# Altium footprint library ParsaLibrary.PcbLib: 526 footprints (part 25 of 33)
Each footprint in its own frame and in the unit in brackets; x right, y up, seen from the top. Pads: shape width x height; smd on the part's side, far side on the other; paste and mask are expansions set on the pad; w line width, h text height; cw(c..) or ccw(c..) is an arc to the next point about the centre after c.
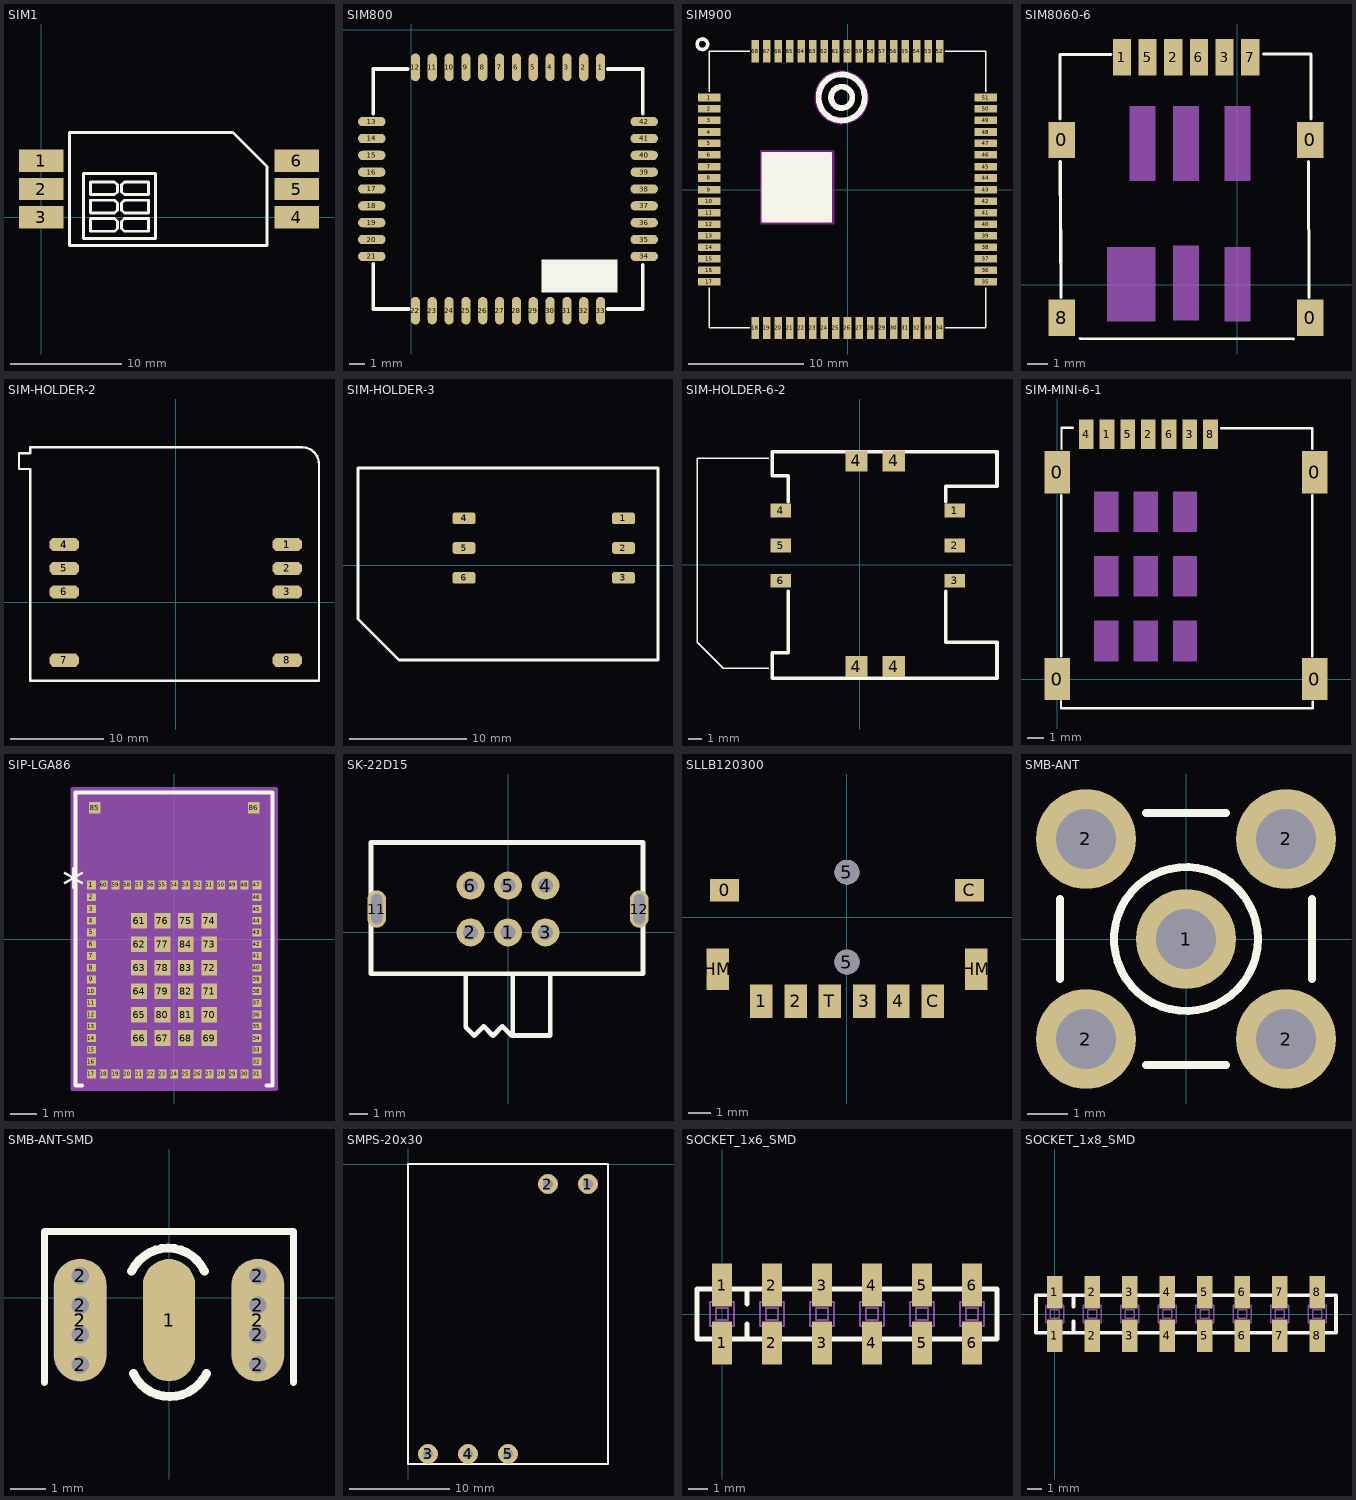
[diagram p24: the footprints below, top view; thin cyan lines are the x and y axes]

## SIM1 [mm]
pads (6):
  rect 4x2 smd: 1(0,5.08) 2(0,2.54) 3(0,0) 4(23,0) 5(23,2.54) 6(23,5.08)
Top Overlay:
  lines w0.254: 2.54,-2.54 20.32,-2.54 20.32,4.572 17.272,7.62 2.54,7.62 2.54,-2.54 ; 3.81,-1.905 10.287,-1.905 10.287,3.937 3.81,3.937 3.81,-1.905 ; 4.445,-1.27 4.445,-0.127 6.604,-0.127 6.858,-0.381 6.858,-1.016 6.604,-1.27 4.445,-1.27 ; 4.445,0.381 4.445,1.524 6.604,1.524 6.858,1.27 6.858,0.635 6.604,0.381 4.445,0.381 ; 4.445,2.032 6.604,2.032 6.858,2.286 6.858,2.921 6.604,3.175 4.445,3.175 4.445,2.032 ; 7.239,-1.016 7.239,-0.381 7.493,-0.127 9.652,-0.127 9.652,-1.27 7.493,-1.27 7.239,-1.016 ; 7.239,0.635 7.493,0.381 9.652,0.381 9.652,1.524 7.493,1.524 7.239,1.27 7.239,0.635 ; 7.239,2.286 7.493,2.032 9.652,2.032 9.652,3.175 7.493,3.175 7.239,2.921 7.239,2.286

## SIM800 [mm]
pads (42):
  oval 0.6x1.8 smd: 1(12.363,-2.44) 2(11.263,-2.44) 3(10.163,-2.44) 4(9.063,-2.44) 5(7.963,-2.44) 6(6.863,-2.44) 7(5.763,-2.44) 8(4.663,-2.44) 9(3.563,-2.44) 10(2.463,-2.44) 11(1.363,-2.44) 12(0.263,-2.44) 22(0.263,-18.34) 23(1.363,-18.34) 24(2.463,-18.34) 25(3.563,-18.34) 26(4.663,-18.34) 27(5.763,-18.34) 28(6.863,-18.34) 29(7.963,-18.34) 30(9.063,-18.34) 31(10.163,-18.34) 32(11.263,-18.34) 33(12.363,-18.34)
  oval 1.8x0.6 smd: 13(-2.587,-5.99) 14(-2.587,-7.09) 15(-2.587,-8.19) 16(-2.587,-9.29) 17(-2.587,-10.39) 18(-2.587,-11.49) 19(-2.587,-12.59) 20(-2.587,-13.69) 21(-2.587,-14.79) 34(15.213,-14.79) 35(15.213,-13.69) 36(15.213,-12.59) 37(15.213,-11.49) 38(15.213,-10.39) 39(15.213,-9.29) 40(15.213,-8.19) 41(15.213,-7.09) 42(15.213,-5.99)
Top Overlay:
  rectangle: 8.509,-17.136 13.459,-14.986
  lines w0.254: -2.487,-15.293 -2.487,-18.24 -0.175,-18.24 ; -2.487,-5.461 -2.487,-2.54 -0.254,-2.54 ; 12.827,-18.24 15.113,-18.24 15.113,-15.367 ; 12.827,-2.54 15.113,-2.54 15.113,-5.461
Multi-Layer:
  pour cut-out: 8.509,-14.986 13.459,-14.986 13.459,-17.136 8.509,-17.136
3D body "User Library-SIM800C.step": height 2.3, standoff -0.01, extent -2.45,-18.264 15.15,-2.564

## SIM900 [mil]
pads (68):
  rect 76x26 smd: 1(-472.72,314.72) 2(-472.72,275.72) 3(-472.72,236.72) 4(-472.72,196.72) 5(-472.72,157.72) 6(-472.72,118.72) 7(-472.72,78.72) 8(-472.72,39.72) 9(-472.72,-0.28) 10(-472.72,-39.65) 11(-472.72,-79.02) 12(-472.72,-118.39) 13(-472.72,-157.76) 14(-472.72,-197.13) 15(-472.72,-236.5) 16(-472.72,-275.87) 17(-472.72,-315.24) 35(472.72,-315.24) 36(472.72,-275.87) 37(472.72,-236.5) 38(472.72,-197.13) 39(472.72,-157.76) 40(472.72,-118.39) 41(472.72,-79.02) 42(472.72,-39.65) 43(472.72,-0.28) 44(472.72,39.72) 45(472.72,78.72) 46(472.72,118.72) 47(472.72,157.72) 48(472.72,196.72) 49(472.72,236.72) 50(472.72,275.72) 51(472.72,314.72)
  rect 26x76 smd: 18(-315.24,-472.72) 19(-275.87,-472.72) 20(-236.5,-472.72) 21(-197.13,-472.72) 22(-157.76,-472.72) 23(-118.39,-472.72) 24(-79.02,-472.72) 25(-39.65,-472.72) 26(-0.28,-472.72) 27(39.72,-472.72) 28(78.72,-472.72) 29(118.72,-472.72) 30(157.72,-472.72) 31(196.72,-472.72) 32(236.72,-472.72) 33(275.72,-472.72) 34(314.72,-472.72) 52(314.72,472.72) 53(275.72,472.72) 54(236.72,472.72) 55(196.72,472.72) 56(157.72,472.72) 57(118.72,472.72) 58(78.72,472.72) 59(39.72,472.72) 60(-0.28,472.72) 61(-39.65,472.72) 62(-79.02,472.72) 63(-118.39,472.72) 64(-157.76,472.72) 65(-197.13,472.72) 66(-236.5,472.72) 67(-275.87,472.72) 68(-315.24,472.72)
Top Overlay:
  circle w19.68: c-20,315 r78.74
  circle w12: c-496.34,496.72 r18
  circle w19.68: c-20,315 r36.4
  rectangle: -291.62,-110.52 -55.4,125.72
  lines w5: -472.72,-334.93 -472.72,-472.72 -334.93,-472.72 ; -472.72,334.72 -472.72,472.72 -334.93,472.72 ; 334.72,-472.72 472.72,-472.72 472.72,-334.93 ; 334.72,472.72 472.72,472.72 472.72,334.72 ; -291.62,-110.52 -291.62,125.72 -55.4,125.72 -55.4,-110.52 -291.62,-110.52
Keep-Out Layer:
  circle w5: c-19.96,314.72 r90.04
  lines w10: -295,-115 -295,130 -50,130 -50,-115 -295,-115
Mechanical 2:
Mechanical 4:
Mechanical 16:
3D body "SIMCOM_SIM900.STEP": height 118.5, standoff 0.16, extent -474.4,-474.41 474.42,474.41

## SIM8060-6 [mm]
pads (10):
  rect 1.3x1.8 smd: 0(-8.693,7.174) 0(3.607,-1.626) 0(3.607,7.174) 8(-8.693,-1.626)
  rect 0.9x1.8 smd: 1(-5.713,11.274) 2(-3.173,11.274) 3(-0.633,11.274) 5(-4.443,11.274) 6(-1.903,11.274) 7(0.637,11.274)
Top Overlay:
  lines w0.15: -8.781,8.216 -8.781,11.416 -6.255,11.416 ; -8.769,6.108 -8.744,-0.623 ; -7.802,-2.647 2.788,-2.681 ; 1.289,11.442 3.651,11.442 3.651,8.216 ; 3.531,6.108 3.556,-0.623
Mechanical 1:
  rectangle: -0.643,5.15 0.657,8.85
  rectangle: -3.193,5.15 -1.893,8.85
  rectangle: -6.453,-1.826 -4.053,1.874
  rectangle: -3.193,-1.753 -1.893,1.947
  rectangle: -0.643,-1.826 0.657,1.874
  rectangle: -5.353,5.15 -4.053,8.85
3D body "User Library-SIM8060.x_t": height 1.4, standoff -0.05, extent -8.764,-2.573 3.636,11.427

## SIM-HOLDER-2 [mm]
pads (10):
  oct 3.2x1.4 smd: 1(11.954,6.2) 1(11.954,6.2) 2(11.954,3.66) 3(11.954,1.12) 4(-11.954,6.2) 4(-11.954,6.2) 5(-11.954,3.66) 6(-11.954,1.12) 7(-11.954,-6.2) 8(11.954,-6.2)
Top Overlay:
  lines w0.254: -15.634,14.304 -16.802,14.304 -16.802,15.981 -15.583,15.981 -15.583,16.619 13.573,16.619 cw(c13.573,14.832) 15.36,14.832 15.36,-8.381 -15.583,-8.381 -15.583,14.304
3D body "912283001.stp": height 3.1, standoff 0, extent -16.84,-8.381 15.36,16.619

## SIM-HOLDER-3 [mm]
pads (7):
  rrect50% 2x1 smd: 1(-4.946,4) 2(-4.946,1.46) 3(-4.946,-1.08) 4(-18.554,4) 4(-18.554,4) 5(-18.554,1.46) 6(-18.554,-1.08)
Top Overlay:
  lines w0.254: -27.6,-4.6 -27.6,8.3 -2,8.3 -2,-8.1 -24.1,-8.1 -27.6,-4.6
3D body "User Library-Sim Card Holder.step": height 1.8, standoff 0, extent -18.3,-8.1 -2,8.3
3D body: height 1.5, standoff 0.8, extent -27.6,-7.4 -2.6,7.6

## SIM-HOLDER-6-2 [mm]
pads (10):
  rect 1.5x1 smd: 1(6.858,3.937) 2(6.858,1.397) 3(6.858,-1.143) 4(-5.742,3.937) 5(-5.742,1.397) 6(-5.742,-1.143)
  rect 1.6x1.5 smd: 4(-0.254,-7.366) 4(-0.254,7.534) 4(2.446,-7.366) 4(2.446,7.534)
Top Overlay:
  lines w0.1: -6.604,-7.493 -9.906,-7.493 -11.811,-5.588 -11.811,7.747 -6.604,7.747
  lines w0.254: -5.207,-1.905 -5.207,-6.35 -6.372,-6.35 -6.372,-8.2 9.928,-8.2 9.928,-5.588 6.223,-5.588 6.223,-1.905 ; -5.207,4.572 -5.207,6.477 -6.372,6.477 -6.372,8.2 9.928,8.2 9.928,5.715 6.223,5.715 6.223,4.572
3D body "693010020611.stp": height 1.8, standoff 0, extent -6.372,-8.2 9.928,8.2

## SIM-MINI-6-1 [mm]
pads (11):
  rect 1.55x2.6 smd: 0(0,0) 0(0,12.68) 0(15.8,0) 0(15.8,12.68)
  rect 0.9x1.8 smd: 1(3.05,15.01) 2(5.59,15.01) 3(8.13,15.01) 4(1.78,15.01) 5(4.32,15.01) 6(6.86,15.01) 8(9.4,15.01)
Top Overlay:
  lines w0.15: 0.232,-1.372 0.232,-1.8 15.642,-1.8 15.671,-1.8 15.671,-1.39 ; 0.261,1.401 0.261,11.273 ; 0.263,14.126 0.263,15.412 0.961,15.412 ; 10.061,15.389 15.657,15.389 15.657,14.126 ; 15.642,1.395 15.642,11.278
Mechanical 1:
  rectangle: 7.089,9.008 8.589,11.508
  rectangle: 4.673,9.008 6.173,11.508
  rectangle: 7.089,5.048 8.589,7.548
  rectangle: 4.673,5.048 6.173,7.548
  rectangle: 2.257,5.048 3.757,7.548
  rectangle: 2.257,1.088 3.757,3.588
  rectangle: 4.673,1.088 6.173,3.588
  rectangle: 7.089,1.088 8.589,3.588
  rectangle: 2.257,9.008 3.757,11.508
3D body "Part1_1.STEP": height 1.35, standoff 0, extent -0.324,-1.641 16.176,15.309

## SIP-LGA86 [mm]
pads (86):
  rect 0.35x0.35 smd paste-0.175 mask-0.178: 1(-3.175,2.075) 17(-3.175,-5.175) 31(3.175,-5.175) 47(3.175,2.075)
  rect 0.35x0.3 smd paste+0 mask+0: 2(-3.175,1.6) 3(-3.175,1.15) 4(-3.175,0.7) 5(-3.175,0.25) 6(-3.175,-0.2) 7(-3.175,-0.65) 8(-3.175,-1.1) 9(-3.175,-1.55) 10(-3.175,-2) 11(-3.175,-2.45) 12(-3.175,-2.9) 13(-3.175,-3.35) 14(-3.175,-3.8) 15(-3.175,-4.25) 16(-3.175,-4.7) 32(3.175,-4.7) 33(3.175,-4.25) 34(3.175,-3.8) 35(3.175,-3.35) 36(3.175,-2.9) 37(3.175,-2.45) 38(3.175,-2) 39(3.175,-1.55) 40(3.175,-1.1) 41(3.175,-0.65) 42(3.175,-0.2) 43(3.175,0.25) 44(3.175,0.7) 45(3.175,1.15) 46(3.175,1.6)
  rect 0.3x0.35 smd paste+0 mask+0: 18(-2.7,-5.175) 19(-2.25,-5.175) 20(-1.8,-5.175) 21(-1.35,-5.175) 22(-0.9,-5.175) 23(-0.45,-5.175) 24(0,-5.175) 25(0.45,-5.175) 26(0.9,-5.175) 27(1.35,-5.175) 28(1.8,-5.175) 29(2.25,-5.175) 30(2.7,-5.175) 48(2.7,2.075) 49(2.25,2.075) 50(1.8,2.075) 51(1.35,2.075) 52(0.9,2.075) 53(0.45,2.075) 54(0,2.075) 55(-0.45,2.075) 56(-0.9,2.075) 57(-1.35,2.075) 58(-1.8,2.075) 59(-2.25,2.075) 60(-2.7,2.075)
  rect 0.6x0.6 smd paste-0.3 mask-0.305: 61(-1.35,0.7) 62(-1.35,-0.2) 63(-1.35,-1.1) 64(-1.35,-2) 65(-1.35,-2.9) 66(-1.35,-3.8) 67(-0.45,-3.8) 68(0.45,-3.8) 69(1.35,-3.8) 70(1.35,-2.9) 71(1.35,-2) 72(1.35,-1.1) 73(1.35,-0.2) 74(1.35,0.7) 75(0.45,0.7) 76(-0.45,0.7) 77(-0.45,-0.2) 78(-0.45,-1.1) 79(-0.45,-2) 80(-0.45,-2.9) 81(0.45,-2.9) 82(0.45,-2) 83(0.45,-1.1) 84(0.45,-0.2)
  rect 0.43x0.43 smd paste-0.215 mask-0.216: 85(-3.05,5.035) 86(3.05,5.035)
Top Overlay:
  lines w0.152: -3.534,-5.627 -3.777,-5.627 -3.777,5.627 3.777,5.627 3.777,-5.627 3.534,-5.627
  text "*" at -4.303,1.44 h1.27
Mechanical 13:
  lines w0.025: -3.65,-5.5 3.65,-5.5 3.65,5.5 -3.65,5.5 -3.65,-5.5
  text "*" at -3.167,1.265 h1.27
Mechanical 15:
  region: 3.904,-5.754 3.904,5.754 -3.904,5.754 -3.904,-5.754
  lines w0.152: -3.904,-5.754 -3.904,5.754 3.904,5.754 3.904,-5.754 -3.904,-5.754
3D body "User Library-SiP-LGA86.X_B": height 1.3, standoff -0.04, extent -3.65,-5.5 3.65,5.5

## SK-22D15 [mm] "2P2T SWITCH"
height 8.5
pads (8):
  round 1.5 hole 0.8: 1(0,0) 2(-2,0) 3(2,0) 4(2,2.5) 5(0,2.5) 6(-2,2.5)
  oval 1x2 hole 0.6 slot 1.6 at 90 deg: 11(-7,1.25) 12(7,1.25)
Top Overlay:
  lines w0.254: -2.25,-5 -2.25,-5.05 ; -2.25,-2.2 -2.25,-5.05 ; 0.2,-5.5 -0.3,-5 -0.8,-5.5 ; 0.25,-2.2 0.25,-5.5 2.25,-5.5 2.25,-2.2 ; -2.25,-5.05 -1.8,-5.5 -1.3,-5 -0.8,-5.5 ; -0.8,-5.5 -0.8,-5.5 ; -7.3,-2.2 -7.3,4.8 7.2,4.8 7.2,-2.2 -7.3,-2.2

## SLLB120300 [mm]
pads (12):
  rect 1.3x1 smd: 0(-5.45,1.2) C(5.45,1.2)
  rect 1x1.5 smd: 1(-3.81,-3.75) 2(-2.286,-3.75) 3(0.762,-3.75) 4(2.286,-3.75) C(3.81,-3.75) T(-0.762,-3.75)
  round 1.1 hole 1.1: 5(0,-2) 5(0,2)
  rect 1x1.85 smd: HM(-5.75,-2.325) HM(5.75,-2.325)
3D body "SLLB120300.STEP": height 3, standoff -0.65, extent -7.299,-4.206 7.299,7.488

## SMB-ANT [mm]
pads (5):
  round 2.5 hole 1.5: 1(0,0) 2(-2.5,-2.5) 2(-2.5,2.5) 2(2.5,-2.5) 2(2.5,2.5)
Top Overlay:
  circle w0.2: c0,0 r1.8
  lines w0.2: -3.15,-1 -3.15,1 ; -1,-3.15 1,-3.15 ; -1,3.15 1,3.15 ; 3.15,-1 3.15,1
Mechanical 1:
  circle w0.025: c0,0 r0.2
  circle w0.025: c0,0 r1.05
  circle w0.025: c0,0 r1.8
3D body "SMB.STEP": height 9.9, standoff -4, extent -2.625,-11.373 2.575,2.627

## SMB-ANT-SMD [mm]
pads (13):
  oval 1.5x3.5 smd: 1(0,-0.635) 2(-2.54,-0.635) 2(2.54,-0.635)
  round 0.9 hole 0.5: 2(-2.54,-1.905) 2(-2.54,-1.058) 2(-2.54,-0.212) 2(-2.54,0.635) 2(2.54,-1.905) 2(2.54,-1.058) 2(2.54,-0.212) 2(2.54,0.635)
  oval 1.5x3.5 smd far side: 2(-2.54,-0.635) 2(2.54,-0.635)
Top Overlay:
  lines w0.2: -3.556,-2.413 -3.556,1.905 3.556,1.905 3.556,-2.413
  lines w0.254: -1.069,0.762 cw(c-0.026,0.276) 1.016,0.762 ; -1.016,-2.159 ccw(c0.026,-1.673) 1.069,-2.159
Mechanical 1:
  circle w0.025: c0,-0.381 r0.2
3D body "User Library-sma-3.step": height 3.84, standoff -2.57, extent -3.073,-1.625 3.327,16.675

## SMPS-20x30 [mm]
pads (5):
  round 2 hole 1: 1(18,-2) 2(14,-2) 3(2,-29) 4(6,-29) 5(10,-29)
Top Overlay:
  lines w0.2: 0,-30 20,-30 20,0 0,0 0,-30

## SOCKET_1x6_SMD [mm]
pads (12):
  rect 1.02x2.19 smd: 1(0,-1.465) 1(0,1.465) 2(2.54,-1.465) 2(2.54,1.465) 3(5.08,-1.465) 3(5.08,1.465) 4(7.62,-1.465) 4(7.62,1.465) 5(10.16,-1.465) 5(10.16,1.465) 6(12.7,1.465) 6(12.7,-1.465)
Top Overlay:
  lines w0.254: 1.27,-1.27 1.27,-0.508 ; 1.27,0.508 1.27,1.27 ; -1.27,-1.27 13.97,-1.27 13.97,1.27 -1.27,1.27 -1.27,-1.27
Mechanical 7:
  lines w0.1: -0.35,-1.27 -0.35,-1.812 ccw(c0,-1.812) 0.35,-1.812 0.35,-1.27 ; 2.19,1.27 2.19,1.812 cw(c2.54,1.812) 2.89,1.812 2.89,1.27 ; 4.73,-1.27 4.73,-1.812 ccw(c5.08,-1.812) 5.43,-1.812 5.43,-1.27 ; 7.27,1.27 7.27,1.812 cw(c7.62,1.812) 7.97,1.812 7.97,1.27 ; 9.81,-1.27 9.81,-1.812 ccw(c10.16,-1.812) 10.51,-1.812 10.51,-1.27 ; 12.35,1.27 12.35,1.812 cw(c12.7,1.812) 13.05,1.812 13.05,1.27 ; -1.27,-1.27 -1.27,1.27 13.97,1.27 13.97,-1.27 -1.27,-1.27 ; -0.6,-0.6 -0.6,0.6 0.6,0.6 0.6,-0.6 -0.6,-0.6 ; -0.3,-0.3 -0.3,0.3 0.3,0.3 0.3,-0.3 -0.3,-0.3 ; 1.94,-0.6 1.94,0.6 3.14,0.6 3.14,-0.6 1.94,-0.6 ; 2.24,-0.3 2.24,0.3 2.84,0.3 2.84,-0.3 2.24,-0.3 ; 4.48,-0.6 4.48,0.6 5.68,0.6 5.68,-0.6 4.48,-0.6 ; 4.78,-0.3 4.78,0.3 5.38,0.3 5.38,-0.3 4.78,-0.3 ; 7.02,-0.6 7.02,0.6 8.22,0.6 8.22,-0.6 7.02,-0.6 ; 7.32,-0.3 7.32,0.3 7.92,0.3 7.92,-0.3 7.32,-0.3 ; 9.56,-0.6 9.56,0.6 10.76,0.6 10.76,-0.6 9.56,-0.6 ; 9.86,-0.3 9.86,0.3 10.46,0.3 10.46,-0.3 9.86,-0.3 ; 12.1,-0.6 12.1,0.6 13.3,0.6 13.3,-0.6 12.1,-0.6 ; 12.4,-0.3 12.4,0.3 13,0.3 13,-0.3 12.4,-0.3
  text ".Designator" at 0.77,-0.2 h0.38
3D body "Samtec-SSM-106-L-SV.step": height 7.47, standoff -0.03, extent -1.27,-2.286 13.97,2.286

## SOCKET_1x8_SMD [mm]
pads (16):
  rect 1.02x2.19 smd: 1(0,-1.465) 1(0,1.465) 2(2.54,-1.465) 2(2.54,1.465) 3(5.08,-1.465) 3(5.08,1.465) 4(7.62,-1.465) 4(7.62,1.465) 5(10.16,-1.465) 5(10.16,1.465) 6(12.7,1.465) 6(12.7,-1.465) 7(15.24,-1.465) 7(15.24,1.465) 8(17.78,-1.465) 8(17.78,1.465)
Top Overlay:
  lines w0.254: 1.27,-1.27 1.27,-0.508 ; 1.27,0.508 1.27,1.27 ; -1.27,-1.27 -1.27,1.27 19.05,1.27 19.05,-1.27 -1.27,-1.27
Mechanical 7:
  lines w0.1: -0.35,-1.27 -0.35,-1.812 ccw(c0,-1.812) 0.35,-1.812 0.35,-1.27 ; 2.19,1.27 2.19,1.812 cw(c2.54,1.812) 2.89,1.812 2.89,1.27 ; 4.73,-1.27 4.73,-1.812 ccw(c5.08,-1.812) 5.43,-1.812 5.43,-1.27 ; 7.27,1.27 7.27,1.812 cw(c7.62,1.812) 7.97,1.812 7.97,1.27 ; 9.81,-1.27 9.81,-1.812 ccw(c10.16,-1.812) 10.51,-1.812 10.51,-1.27 ; 12.35,1.27 12.35,1.812 cw(c12.7,1.812) 13.05,1.812 13.05,1.27 ; 14.89,-1.27 14.89,-1.812 ccw(c15.24,-1.812) 15.59,-1.812 15.59,-1.27 ; 17.43,1.27 17.43,1.812 cw(c17.78,1.812) 18.13,1.812 18.13,1.27 ; -1.27,-1.27 -1.27,1.27 19.05,1.27 19.05,-1.27 -1.27,-1.27 ; -0.6,-0.6 -0.6,0.6 0.6,0.6 0.6,-0.6 -0.6,-0.6 ; -0.3,-0.3 -0.3,0.3 0.3,0.3 0.3,-0.3 -0.3,-0.3 ; 1.94,-0.6 1.94,0.6 3.14,0.6 3.14,-0.6 1.94,-0.6 ; 2.24,-0.3 2.24,0.3 2.84,0.3 2.84,-0.3 2.24,-0.3 ; 4.48,-0.6 4.48,0.6 5.68,0.6 5.68,-0.6 4.48,-0.6 ; 4.78,-0.3 4.78,0.3 5.38,0.3 5.38,-0.3 4.78,-0.3 ; 7.02,-0.6 7.02,0.6 8.22,0.6 8.22,-0.6 7.02,-0.6 ; 7.32,-0.3 7.32,0.3 7.92,0.3 7.92,-0.3 7.32,-0.3 ; 9.56,-0.6 9.56,0.6 10.76,0.6 10.76,-0.6 9.56,-0.6 ; 9.86,-0.3 9.86,0.3 10.46,0.3 10.46,-0.3 9.86,-0.3 ; 12.1,-0.6 12.1,0.6 13.3,0.6 13.3,-0.6 12.1,-0.6 ; 12.4,-0.3 12.4,0.3 13,0.3 13,-0.3 12.4,-0.3 ; 14.64,-0.6 14.64,0.6 15.84,0.6 15.84,-0.6 14.64,-0.6 ; 14.94,-0.3 14.94,0.3 15.54,0.3 15.54,-0.3 14.94,-0.3 ; 17.18,-0.6 17.18,0.6 18.38,0.6 18.38,-0.6 17.18,-0.6 ; 17.48,-0.3 17.48,0.3 18.08,0.3 18.08,-0.3 17.48,-0.3
  text ".Designator" at 0.77,-0.2 h0.38
3D body "Samtec-SSM-108-L-SV.step": height 7.47, standoff -0.03, extent -1.27,-2.286 19.05,2.286